# Altium footprint library std-smt.PcbLib: 117 footprints (part 7 of 8)
Each footprint in its own frame and in the unit in brackets; x right, y up, seen from the top. Pads: shape width x height; smd on the part's side, far side on the other; paste and mask are expansions set on the pad; w line width, h text height; cw(c..) or ccw(c..) is an arc to the next point about the centre after c.
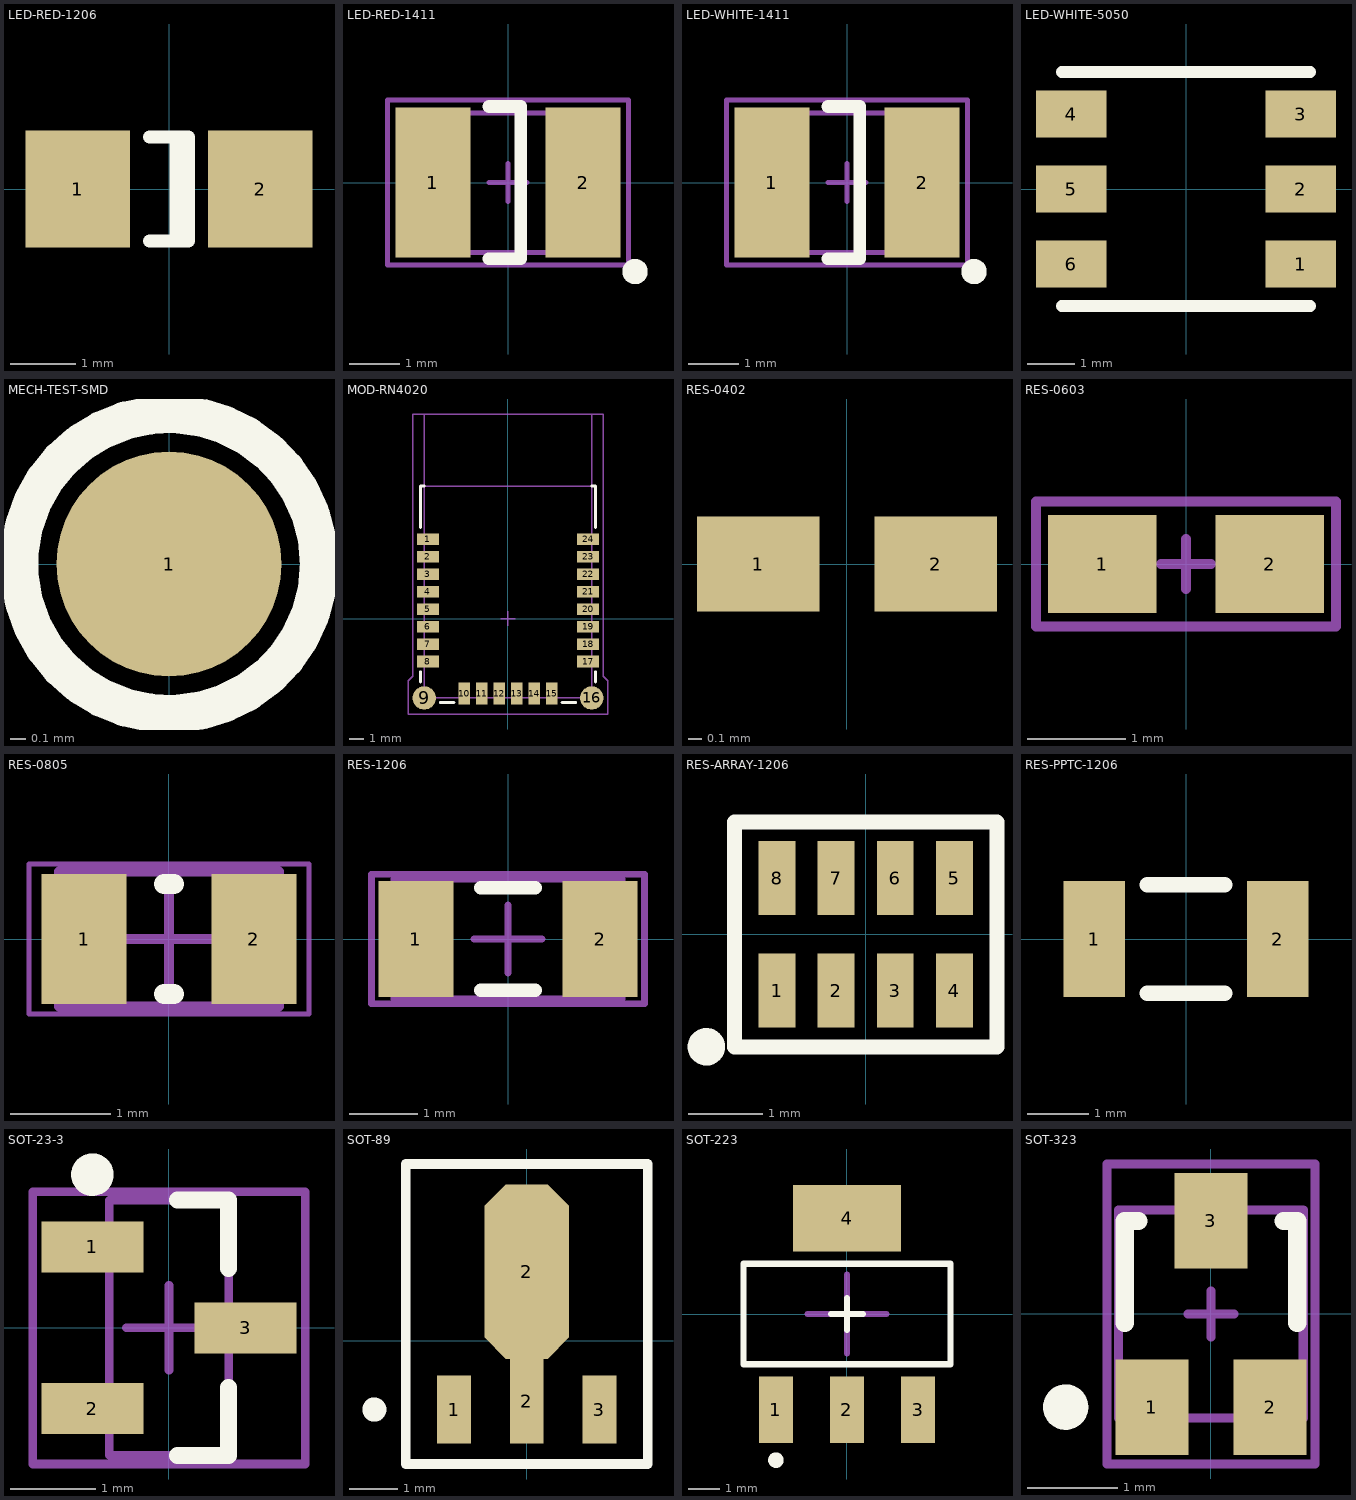
[diagram p6: the footprints below, top view; thin cyan lines are the x and y axes]

## LED-RED-1206 [mm] "SMD LED, red, 1206"
height 1.35
pads (2):
  rect 1.6x1.8 smd: 1(-1.4,0) 2(1.4,0)
Top Overlay:
  lines w0.2: -0.3,-0.8 0.3,-0.8 0.3,0.8 -0.3,0.8 ; 0.11,-0.8 0.11,0.8
3D body: height 1.11, standoff -0.4, extent -1.6,-0.787 1.6,0.813

## LED-RED-1411 [mm] "Led, RED, 2.8 mm x 3.5 mm body, SMD"
height 1.9
pads (2):
  rect 1.5x3 smd: 1(-1.5,0) 2(1.5,0)
Top Overlay:
  circle w0.254: c2.54,-1.778 r0.127
  lines w0.254: -0.381,-1.524 0.254,-1.524 0.254,1.524 -0.381,1.524
Mechanical 13:
  lines w0.1: -1.778,-1.397 1.778,-1.397 1.778,1.397 -1.778,1.397 -1.778,-1.397
Mechanical 15:
  lines w0.1: -0.381,0 0.381,0 ; 0,-0.381 0,0.381 ; -2.413,-1.651 2.413,-1.651 2.413,1.651 -2.413,1.651 -2.413,-1.651
3D body: height 1.1, standoff 0.6, extent -1.19,-1.198 1.2,1.198
3D body: height 1.75, standoff -0.06, extent -1.75,-1.4 1.75,1.4

## LED-WHITE-1411 [mm] "Led, White, 2.8 mm x 3.5 mm body, SMD"
height 1.9
pads (2):
  rect 1.5x3 smd: 1(-1.5,0) 2(1.5,0)
Top Overlay:
  circle w0.254: c2.54,-1.778 r0.127
  lines w0.254: -0.381,-1.524 0.254,-1.524 0.254,1.524 -0.381,1.524
Mechanical 13:
  lines w0.1: -1.778,-1.397 -1.778,1.397 1.778,1.397 1.778,-1.397 -1.778,-1.397
Mechanical 15:
  lines w0.1: -0.381,0 0.381,0 ; 0,-0.381 0,0.381 ; -2.413,-1.651 -2.413,1.651 2.413,1.651 2.413,-1.651 -2.413,-1.651
3D body: height 1.1, standoff 0.6, extent -1.19,-1.198 1.2,1.198
3D body: height 1.75, standoff -0.06, extent -1.75,-1.4 1.75,1.4

## LED-WHITE-5050 [mm] "LED, white, SMD, 5050"
height 2
pads (6):
  rect 1.5x1 smd: 1(2.45,-1.6) 2(2.45,0) 3(2.45,1.6) 4(-2.45,1.6) 5(-2.45,0) 6(-2.45,-1.6)
Top Overlay:
  lines w0.254: -2.65,-2.5 2.65,-2.5 ; -2.65,2.5 2.65,2.5
3D body: height 1.6, standoff 0, extent -2.65,-2.5 2.65,2.5

## MECH-TEST-SMD [mm] "Test point, 2.5 mm, no via"
pads (1):
  round 1.5 smd: 1(0,0)
Top Overlay:
  circle w0.254: c0,0 r1

## MOD-RN4020 [mm] "Bluetooth module, 24 pin"
height 2.5
pads (24):
  rect 1.5x0.8 smd: 1(-5.5,5.45) 2(-5.5,4.25) 3(-5.5,3.05) 4(-5.5,1.85) 5(-5.5,0.65) 6(-5.5,-0.55) 7(-5.5,-1.75) 8(-5.5,-2.95) 17(5.5,-2.95) 18(5.5,-1.75) 19(5.5,-0.55) 20(5.5,0.65) 21(5.5,1.85) 22(5.5,3.05) 23(5.5,4.25) 24(5.5,5.45)
  round 1.6 smd: 9(-5.75,-5.45) 16(5.75,-5.45)
  rect 0.8x1.5 smd: 10(-3,-5.15) 11(-1.8,-5.15) 12(-0.6,-5.15) 13(0.6,-5.15) 14(1.8,-5.15) 15(3,-5.15)
Top Overlay:
  lines w0.2: -6,-4.35 -6,-3.65 ; -6,6.25 -6,9.1 -5.75,9.1 ; -4.65,-5.75 -3.7,-5.75 ; 3.7,-5.75 4.65,-5.75 ; 5.75,9.1 6,9.1 6,6.25 ; 6,-4.35 6,-3.65
Mechanical 11:
  lines w0.1: -5.75,9.1 5.75,9.1 ; -5.75,-5.45 5.75,-5.45 5.75,14.05 -5.75,14.05 -5.75,-5.45
Mechanical 15:
  lines w0.1: -0.5,0 0.5,0 ; 0,-0.5 0,0.5 ; -6.85,-6.55 6.85,-6.55 6.85,-4.25 6.55,-3.95 6.55,14.05 -6.55,14.05 -6.55,-3.95 -6.85,-4.25 -6.85,-6.55
3D body: height 2.3, standoff 0.8, extent -4.95,-4.95 4.95,9.55
3D body: height 0.8, standoff 0, extent -5.75,-5.45 5.75,14.05

## RES-0402 [mm] "Resistor, SMD, 0402"
height 0.508
pads (2):
  rect 0.9x0.7 smd: 1(-0.65,0) 2(0.65,0)
3D body: height 0.4, standoff 0, extent -0.5,-0.25 0.5,0.25

## RES-0603 [mm] "SMD resistor, 0603"
height 1.397
pads (2):
  rect 1.1x1 smd: 1(-0.85,0) 2(0.85,0)
Mechanical 15:
  lines w0.1: -0.254,0 0.254,0 ; 0,-0.254 0,0.254 ; -1.524,-0.635 1.524,-0.635 1.524,0.635 -1.524,0.635 -1.524,-0.635
3D body: height 0.55, standoff 0, extent -0.8,-0.4 0.8,0.4

## RES-0805 [mm] "Chip Resistor, Body 2.0x1.3mm, IPC High Density"
height 0.7
pads (2):
  rect 0.85x1.3 smd: 1(-0.85,0) 2(0.85,0)
Top Overlay:
  lines w0.2: -0.05,-0.55 0.05,-0.55 ; -0.05,0.55 0.05,0.55
Mechanical 13:
  lines w0.1: -1.1,-0.675 1.1,-0.675 1.1,0.675 -1.1,0.675 -1.1,-0.675
Mechanical 15:
  lines w0.05: -1.4,-0.75 1.4,-0.75 1.4,0.75 -1.4,0.75 -1.4,-0.75
  lines w0.1: -0.5,0 0.5,0 ; 0,-0.5 0,0.5
3D body: height 0.78, standoff 0, extent -1,-0.625 1,0.625

## RES-1206 [mm] "SMD resistor, 1206"
height 0.635
pads (2):
  rect 1.1x1.7 smd: 1(-1.35,0) 2(1.35,0)
Top Overlay:
  lines w0.2: -0.4,-0.75 0.4,-0.75 ; -0.4,0.75 0.4,0.75
Mechanical 13:
  lines w0.1: -1.675,-0.875 1.675,-0.875 1.675,0.875 -1.675,0.875 -1.675,-0.875
Mechanical 15:
  lines w0.1: -0.5,0 0.5,0 ; 0,-0.5 0,0.5 ; -2,-0.95 2,-0.95 2,0.95 -2,0.95 -2,-0.95
3D body: height 1, standoff 0, extent -1.6,-0.8 1.6,0.8

## RES-ARRAY-1206 [mm] "Yageo Resistor Array, TC164, 1206"
height 0.6
pads (8):
  rect 0.5x1 smd: 1(-1.2,-0.762) 2(-0.4,-0.762) 3(0.4,-0.762) 4(1.2,-0.762) 5(1.2,0.762) 6(0.4,0.762) 7(-0.4,0.762) 8(-1.2,0.762)
Top Overlay:
  circle w0.254: c-2.159,-1.524 r0.127
  lines w0.203: -1.778,-1.524 1.778,-1.524 1.778,1.524 -1.778,1.524 -1.778,-1.524
3D body: height 0.55, standoff 0, extent -1.6,-0.8 1.6,0.8

## RES-PPTC-1206 [mm] "Resettable fuse, surface mount, 1206"
height 0.4
pads (2):
  rect 1x1.9 smd: 1(-1.5,0) 2(1.5,0)
Top Overlay:
  lines w0.254: -0.635,-0.889 0.635,-0.889 ; -0.635,0.889 0.635,0.889
3D body: height 0.56, standoff 0, extent -1.601,-0.826 1.601,0.826

## SOT-23-3 [mm] "SOT23, 3-Leads, Body 2.9x1.3mm, Pitch 0.95mm, Lead Span 2.5mm, IPC High Density"
height 1.1
pads (3):
  rect 1.2x0.6 smd: 1(-0.9,0.95) 2(-0.9,-0.95) 3(0.9,0)
Top Overlay:
  circle w0.25: c-0.9,1.8 r0.125
  lines w0.2: 0.1,-1.5 0.7,-1.5 0.7,-0.7 ; 0.1,1.5 0.7,1.5 0.7,0.7
Mechanical 13:
  lines w0.1: -0.7,-1.5 0.7,-1.5 0.7,1.5 -0.7,1.5 -0.7,-1.5
Mechanical 15:
  lines w0.1: -0.5,0 0.5,0 ; 0,-0.5 0,0.5 ; -1.6,-1.6 1.6,-1.6 1.6,1.6 -1.6,1.6 -1.6,-1.6
3D body: height 1.05, standoff -0.05, extent -1.25,-1.5 1.25,1.5

## SOT-89 [mm] "SOT-89; Body 4.7 x 4.5 mm, inc. leads (LxW max)"
height 1.7
pads (4):
  rect 0.7x1.4 smd: 1(-1.5,-1.425) 3(1.5,-1.425)
  rect 0.7x1.75 smd: 2(0,-1.25)
  oct 1.75x3.6 smd: 2(0,1.425)
Top Overlay:
  circle w0.25: c-3.15,-1.425 r0.125
  lines w0.2: -2.5,-2.55 2.5,-2.55 2.5,3.65 -2.5,3.65 -2.5,-2.55
3D body: height 1.51, standoff 0, extent -2.25,-1.6 2.25,2.7

## SOT-223 [mm] "SOT-223/SC-73; 4 Leads; Body 6.7 x 7.3 mm, inc. leads (LxW max)"
height 1.8
pads (4):
  rect 1.1x2.15 smd: 1(-2.3,-3.1) 2(0,-3.1) 3(2.3,-3.1)
  rect 3.5x2.15 smd: 4(0,3.1)
Top Overlay:
  circle w0.25: c-2.3,-4.725 r0.125
  lines w0.2: -3.35,-1.625 -3.35,1.625 3.35,1.625 3.35,-1.625 -3.35,-1.625
  lines w0.203: -0.508,0 0.508,0 ; 0,-0.508 0,0.508
Mechanical 15:
  lines w0.203: -1.27,0 1.27,0 ; 0,-1.27 0,1.27
3D body: height 1.86, standoff -0.04, extent -3.321,-3.674 3.379,3.53

## SOT-323 [mm] "SOT-323/SC-70; 3 Leads; Body 2.2 x 2.2 mm, inc. leads (LxW max)"
height 1
pads (3):
  rect 0.8x1.05 smd: 1(-0.65,-1.025) 2(0.65,-1.025) 3(0,1.025)
Top Overlay:
  circle w0.25: c-1.6,-1.025 r0.125
  lines w0.2: -0.95,-0.1 -0.95,1.025 -0.8,1.025 ; 0.8,1.025 0.95,1.025 0.95,-0.1
Mechanical 13:
  lines w0.1: -1.016,-1.143 1.016,-1.143 1.016,1.143 -1.016,1.143 -1.016,-1.143
Mechanical 15:
  lines w0.1: -0.254,0 0.254,0 ; 0,-0.254 0,0.254 ; -1.143,-1.651 1.143,-1.651 1.143,1.651 -1.143,1.651 -1.143,-1.651
3D body: height 1, standoff 0, extent -1.05,-1.15 1.05,1.15